# Altium footprint library 1.27插件排母.PcbLib: 33 footprints (part 3 of 3)
Each footprint in its own frame and in the unit in brackets; x right, y up, seen from the top. Pads: shape width x height; smd on the part's side, far side on the other; paste and mask are expansions set on the pad; w line width, h text height; cw(c..) or ccw(c..) is an arc to the next point about the centre after c.
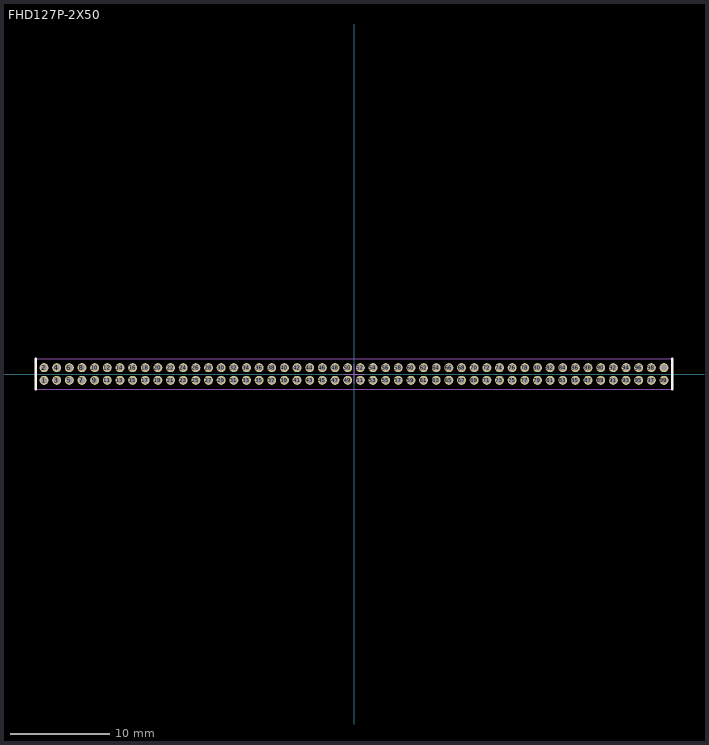
[diagram p2: the footprint, top view; thin cyan lines are the x and y axes]

## FHD127P-2X50 [mm] "1.27mm脚距 插件 双排母"
height 3.4
pads (100):
  round 0.9 hole 0.6: 1(-31.115,-0.635) 2(-31.115,0.635) 3(-29.845,-0.635) 4(-29.845,0.635) 5(-28.575,-0.635) 6(-28.575,0.635) 7(-27.305,-0.635) 8(-27.305,0.635) 9(-26.035,-0.635) 10(-26.035,0.635) 11(-24.765,-0.635) 12(-24.765,0.635) 13(-23.495,-0.635) 14(-23.495,0.635) 15(-22.225,-0.635) 16(-22.225,0.635) 17(-20.955,-0.635) 18(-20.955,0.635) 19(-19.685,-0.635) 20(-19.685,0.635) 21(-18.415,-0.635) 22(-18.415,0.635) 23(-17.145,-0.635) 24(-17.145,0.635) 25(-15.875,-0.635) 26(-15.875,0.635) 27(-14.605,-0.635) 28(-14.605,0.635) 29(-13.335,-0.635) 30(-13.335,0.635) 31(-12.065,-0.635) 32(-12.065,0.635) 33(-10.795,-0.635) 34(-10.795,0.635) 35(-9.525,-0.635) 36(-9.525,0.635) 37(-8.255,-0.635) 38(-8.255,0.635) 39(-6.985,-0.635) 40(-6.985,0.635) 41(-5.715,-0.635) 42(-5.715,0.635) 43(-4.445,-0.635) 44(-4.445,0.635) 45(-3.175,-0.635) 46(-3.175,0.635) 47(-1.905,-0.635) 48(-1.905,0.635) 49(-0.635,-0.635) 50(-0.635,0.635) 51(0.635,-0.635) 52(0.635,0.635) 53(1.905,-0.635) 54(1.905,0.635) 55(3.175,-0.635) 56(3.175,0.635) 57(4.445,-0.635) 58(4.445,0.635) 59(5.715,-0.635) 60(5.715,0.635) 61(6.985,-0.635) 62(6.985,0.635) 63(8.255,-0.635) 64(8.255,0.635) 65(9.525,-0.635) 66(9.525,0.635) 67(10.795,-0.635) 68(10.795,0.635) 69(12.065,-0.635) 70(12.065,0.635) 71(13.335,-0.635) 72(13.335,0.635) 73(14.605,-0.635) 74(14.605,0.635) 75(15.875,-0.635) 76(15.875,0.635) 77(17.145,-0.635) 78(17.145,0.635) 79(18.415,-0.635) 80(18.415,0.635) 81(19.685,-0.635) 82(19.685,0.635) 83(20.955,-0.635) 84(20.955,0.635) 85(22.225,-0.635) 86(22.225,0.635) 87(23.495,-0.635) 88(23.495,0.635) 89(24.765,-0.635) 90(24.765,0.635) 91(26.035,-0.635) 92(26.035,0.635) 93(27.305,-0.635) 94(27.305,0.635) 95(28.575,-0.635) 96(28.575,0.635) 97(29.845,-0.635) 98(29.845,0.635) 99(31.115,-0.635) 100(31.115,0.635)
Top Overlay:
  lines w0.254: -31.94,-1.55 -31.94,1.55 ; 31.94,-1.55 31.94,1.55
Mechanical 13:
  lines w0.1: -31.94,-1.55 31.94,-1.55 31.94,1.55 -31.94,1.55 -31.94,-1.55
Mechanical 15:
  lines w0.1: -1,0 1,0 ; 0,-1 0,1
3D body: height 3.4, standoff -2.4, extent -31.952,-1.5 31.928,1.5